# Altium footprint library DipComponent.PcbLib: 303 footprints (part 9 of 19)
Each footprint in its own frame and in the unit in brackets; x right, y up, seen from the top. Pads: shape width x height; smd on the part's side, far side on the other; paste and mask are expansions set on the pad; w line width, h text height; cw(c..) or ccw(c..) is an arc to the next point about the centre after c.
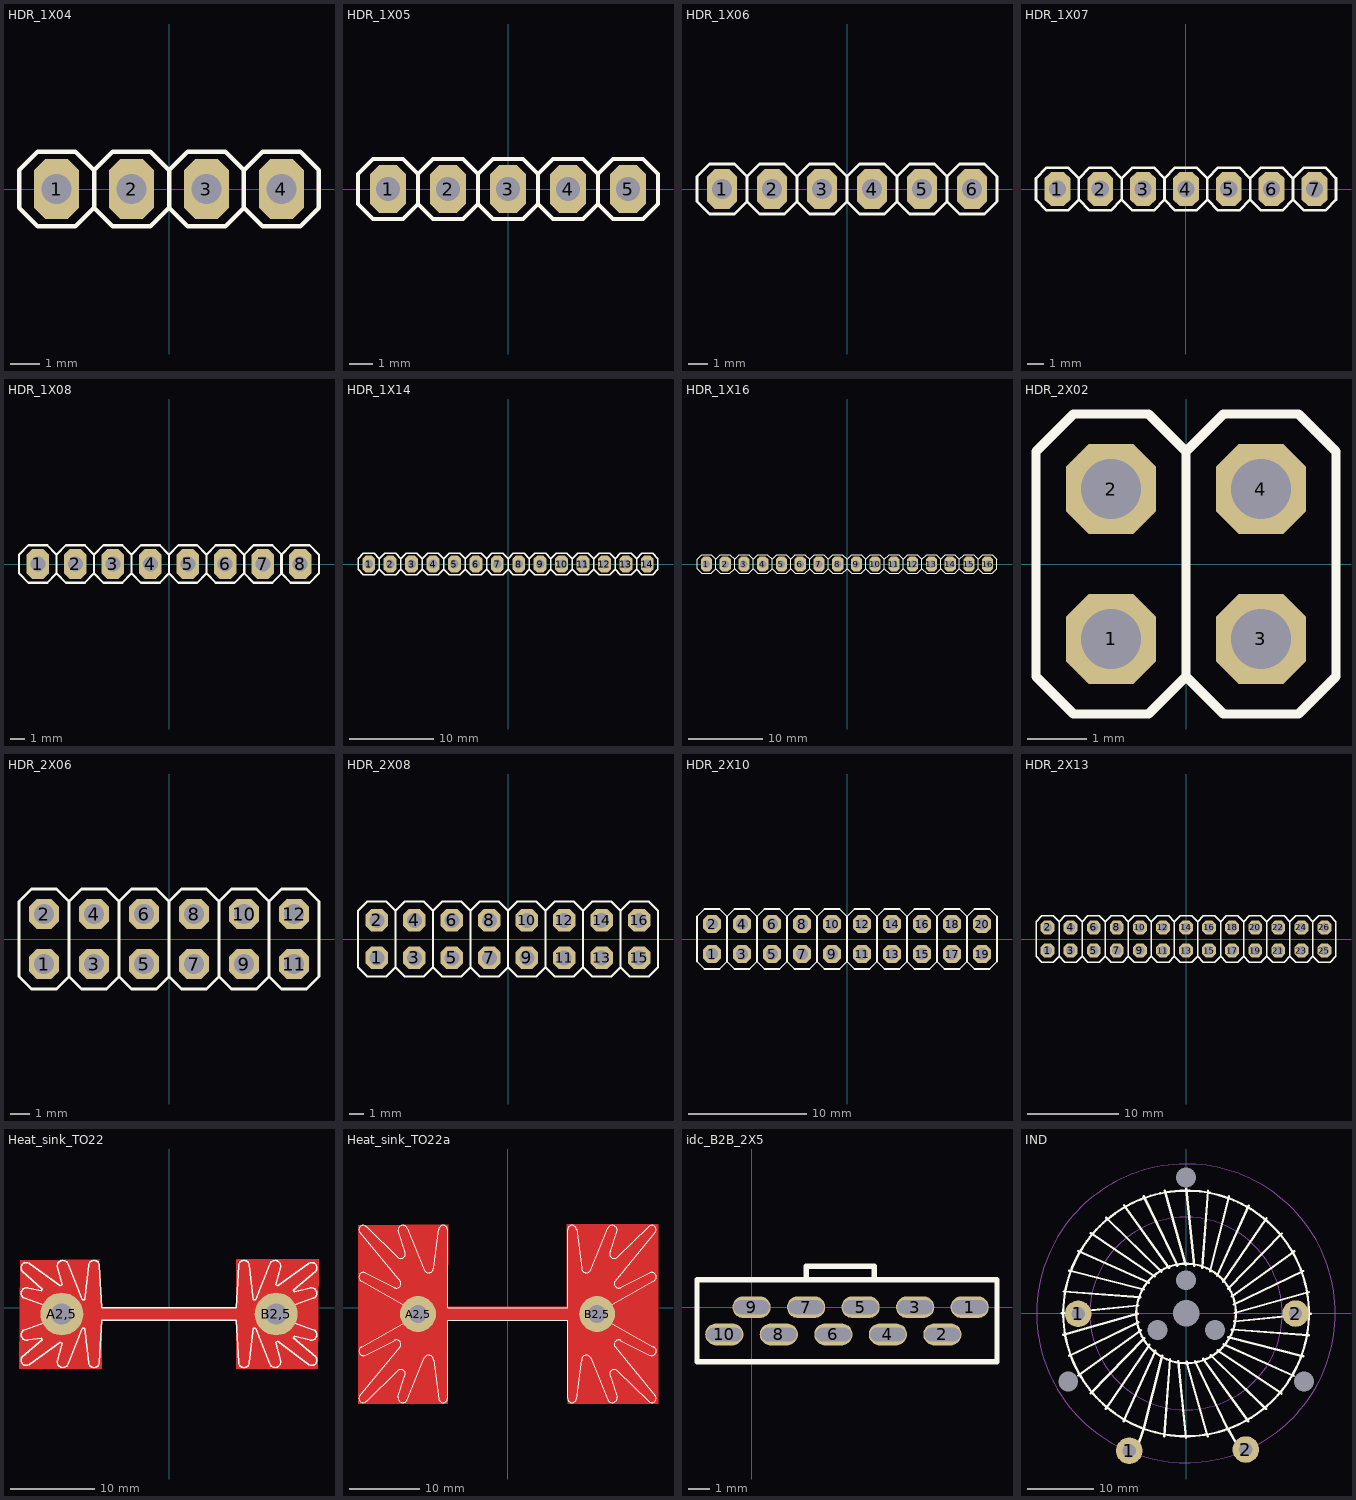
[diagram p8: the footprints below, top view; thin cyan lines are the x and y axes]

## HDR_1X04 [mil]
pads (4):
  oct 60x80 hole 40: 1(-150,0) 2(-50,0) 3(50,0) 4(150,0)
Top Overlay:
  rectangle: 40,-10 60,10
  rectangle: -60,-10 -40,10
  rectangle: -160,-10 -140,10
  rectangle: 140,-10 160,10
  lines w6: -100,-25 -100,25 ; -100,-25 -125,-50 -175,-50 -200,-25 -200,25 -175,50 -125,50 -100,25 ; -100,-25 -75,-50 -25,-50 0,-25 ; -100,25 -75,50 -25,50 0,25 ; 0,-25 25,-50 75,-50 100,-25 ; 0,-25 0,25 ; 0,25 25,50 75,50 100,25 ; 100,-25 100,25 ; 100,-25 125,-50 175,-50 200,-25 200,25 175,50 125,50 100,25
3D body "User Library-Header Vertical 2_54mm Pitch2-14 Way.STEP": height 233.86, standoff -115.75, extent -198.03,-49.21 201.97,50.79

## HDR_1X05 [mil]
pads (5):
  oct 60x80 hole 40: 1(-200,0) 2(-100,0) 3(0,0) 4(100,0) 5(200,0)
Top Overlay:
  rectangle: 90,-10 110,10
  rectangle: -10,-10 10,10
  rectangle: -110,-10 -90,10
  rectangle: -210,-10 -190,10
  rectangle: 190,-10 210,10
  lines w6: -150,-25 -150,25 ; -150,-25 -175,-50 -225,-50 -250,-25 -250,25 -225,50 -175,50 -150,25 ; -150,-25 -125,-50 -75,-50 -50,-25 ; -150,25 -125,50 -75,50 -50,25 ; -50,-25 -25,-50 25,-50 50,-25 ; -50,-25 -50,25 ; -50,25 -25,50 25,50 50,25 ; 50,-25 50,25 ; 50,-25 75,-50 125,-50 150,-25 ; 50,25 75,50 125,50 150,25 ; 150,-25 150,25 ; 150,-25 175,-50 225,-50 250,-25 250,25 225,50 175,50 150,25
3D body "PinHeader 1X5.step": height 335.04, standoff -144.88, extent -250,-59.06 250,55.91

## HDR_1X06 [mil]
pads (6):
  oct 60x80 hole 40: 1(-250,0) 2(-150,0) 3(-50,0) 4(50,0) 5(150,0) 6(250,0)
Top Overlay:
  rectangle: 240,-10 260,10
  rectangle: -260,-10 -240,10
  rectangle: -160,-10 -140,10
  rectangle: -60,-10 -40,10
  rectangle: 40,-10 60,10
  rectangle: 140,-10 160,10
  lines w6: -200,-25 -175,-50 -125,-50 -100,-25 ; -200,-25 -225,-50 -275,-50 -300,-25 -300,25 -275,50 -225,50 -200,25 ; -200,-25 -200,25 ; -200,25 -175,50 -125,50 -100,25 ; -100,-25 -100,25 ; -100,-25 -75,-50 -25,-50 0,-25 ; -100,25 -75,50 -25,50 0,25 ; 0,-25 25,-50 75,-50 100,-25 ; 0,-25 0,25 ; 0,25 25,50 75,50 100,25 ; 100,-25 125,-50 175,-50 200,-25 ; 100,-25 100,25 ; 100,25 125,50 175,50 200,25 ; 200,-25 225,-50 275,-50 300,-25 300,25 275,50 225,50 200,25 ; 200,-25 200,25
3D body "User Library-Header Vertical 2_54mm Pitch2-16 Way.STEP": height 233.86, standoff -115.75, extent -300,-51.18 300,48.82

## HDR_1X07 [mil]
pads (7):
  oct 60x80 hole 40: 1(-300.2,0) 2(-200.2,0) 3(-100.2,0) 4(-0.2,0) 5(99.8,0) 6(199.8,0) 7(300.2,0)
Top Overlay:
  rectangle: 189.8,-10 209.8,10
  rectangle: -310.2,-10 -290.2,10
  rectangle: -210.2,-10 -190.2,10
  rectangle: -110.2,-10 -90.2,10
  rectangle: -10.2,-10 9.8,10
  rectangle: 89.8,-10 109.8,10
  rectangle: 290.2,-10 310.2,10
  lines w6: -250.2,-25 -225.2,-50 -175.2,-50 -150.2,-25 ; -250.2,-25 -275.2,-50 -325.2,-50 -350.2,-25 -350.2,25 -325.2,50 -275.2,50 -250.2,25 ; -250.2,-25 -250.2,25 ; -250.2,25 -225.2,50 -175.2,50 -150.2,25 ; -150.2,-25 -150.2,25 ; -150.2,-25 -125.2,-50 -75.2,-50 -50.2,-25 ; -150.2,25 -125.2,50 -75.2,50 -50.2,25 ; -50.2,-25 -25.2,-50 24.8,-50 49.8,-25 ; -50.2,-25 -50.2,25 ; -50.2,25 -25.2,50 24.8,50 49.8,25 ; 49.8,-25 74.8,-50 124.8,-50 149.8,-25 ; 49.8,-25 49.8,25 ; 49.8,25 74.8,50 124.8,50 149.8,25 ; 149.8,-25 174.8,-50 224.8,-50 249.8,-25 249.8,25 224.8,50 174.8,50 149.8,25 ; 149.8,-25 149.8,25 ; 250.2,-25 250.2,25 275.2,50 325.2,50 350.2,25 350.2,-25 325.2,-50 275.2,-50 250.2,-25
3D body "User Library-Header_Male_7Pin.STEP": height 336.22, standoff -118.11, extent -348.03,-48.82 351.97,49.21

## HDR_1X08 [mil]
pads (8):
  oct 60x80 hole 40: 1(-350,0) 2(-250,0) 3(-150,0) 4(-50,0) 5(50,0) 6(150,0) 7(250.39,0) 8(350,0)
Top Overlay:
  rectangle: 240.39,-10 260.39,10
  rectangle: 40,-10 60,10
  rectangle: -60,-10 -40,10
  rectangle: -160,-10 -140,10
  rectangle: -260,-10 -240,10
  rectangle: -360,-10 -340,10
  rectangle: 140,-10 160,10
  rectangle: 340,-10 360,10
  lines w6: 299.61,-25 299.61,25 ; -300,-25 -300,25 ; -300,-25 -325,-50 -375,-50 -400,-25 -400,25 -375,50 -325,50 -300,25 ; -300,-25 -275,-50 -225,-50 -200,-25 ; -300,25 -275,50 -225,50 -200,25 ; -200,-25 -175,-50 -125,-50 -100,-25 ; -200,-25 -200,25 ; -200,25 -175,50 -125,50 -100,25 ; -100,-25 -100,25 ; -100,-25 -75,-50 -25,-50 0,-25 ; -100,25 -75,50 -25,50 0,25 ; 0,-25 0,25 ; 0,-25 25,-50 75,-50 100,-25 ; 0,25 25,50 75,50 100,25 ; 100,-25 100,25 ; 100,-25 125,-50 175,-50 200,-25 200,25 175,50 125,50 100,25 ; 200.39,-25 225.39,-50 275.39,-50 300.39,-25 300.39,25 275.39,50 225.39,50 200.39,25 200.39,-25 ; 300,-25 300,25 325,50 375,50 400,25 400,-25 375,-50 325,-50 300,-25
3D body "User Library-Header_Male_8Pin.STEP": height 336.22, standoff -118.11, extent -400,-49.01 400,49.02

## HDR_1X14 [mil]
pads (14):
  oct 60x80 hole 40: 1(-650,0) 2(-550,0) 3(-450,0) 4(-350,0) 5(-250,0) 6(-150,0) 7(-50,0) 8(50,0) 9(150,0) 10(250,0) 11(350,0) 12(450,0) 13(550,0) 14(650,0)
Top Overlay:
  rectangle: 540,-10 560,10
  rectangle: 440,-10 460,10
  rectangle: 340,-10 360,10
  rectangle: 240,-10 260,10
  rectangle: 140,-10 160,10
  rectangle: 40,-10 60,10
  rectangle: -60,-10 -40,10
  rectangle: -160,-10 -140,10
  rectangle: -260,-10 -240,10
  rectangle: -360,-10 -340,10
  rectangle: -460,-10 -440,10
  rectangle: -560,-10 -540,10
  rectangle: -660,-10 -640,10
  rectangle: 640,-10 660,10
  lines w6: -600,-25 -600,25 ; -600,-25 -625,-50 -675,-50 -700,-25 -700,25 -675,50 -625,50 -600,25 ; -600,-25 -575,-50 -525,-50 -500,-25 ; -600,25 -575,50 -525,50 -500,25 ; -500,-25 -475,-50 -425,-50 -400,-25 ; -500,-25 -500,25 ; -500,25 -475,50 -425,50 -400,25 ; -400,-25 -400,25 ; -400,-25 -375,-50 -325,-50 -300,-25 ; -400,25 -375,50 -325,50 -300,25 ; -300,-25 -300,25 ; -300,-25 -275,-50 -225,-50 -200,-25 ; -300,25 -275,50 -225,50 -200,25 ; -200,-25 -175,-50 -125,-50 -100,-25 ; -200,-25 -200,25 ; -200,25 -175,50 -125,50 -100,25 ; -100,-25 -100,25 ; -100,-25 -75,-50 -25,-50 0,-25 ; -100,25 -75,50 -25,50 0,25 ; 0,-25 0,25 ; 0,-25 25,-50 75,-50 100,-25 ; 0,25 25,50 75,50 100,25 ; 100,-25 125,-50 175,-50 200,-25 ; 100,-25 100,25 ; 100,25 125,50 175,50 200,25 ; 200,-25 200,25 ; 200,-25 225,-50 275,-50 300,-25 ; 200,25 225,50 275,50 300,25 ; 300,-25 300,25 ; 300,-25 325,-50 375,-50 400,-25 ; 300,25 325,50 375,50 400,25 ; 400,-25 425,-50 475,-50 500,-25 ; 400,-25 400,25 ; 400,25 425,50 475,50 500,25 ; 500,-25 500,25 ; 500,-25 525,-50 575,-50 600,-25 ; 500,25 525,50 575,50 600,25 ; 600,-25 600,25 ; 600,-25 625,-50 675,-50 700,-25 700,25 675,50 625,50 600,25
3D body "User Library-Header Vertical 2_54mm Pitch2-12 Way.STEP": height 233.86, standoff -115.75, extent 502.76,-51.97 702.76,48.03
3D body "User Library-Header Vertical 2_54mm Pitch2-16 Way.STEP": height 233.86, standoff -115.75, extent -698.81,-50.79 -98.81,49.21
3D body "User Library-Header Vertical 2_54mm Pitch2-16 Way.STEP": height 233.86, standoff -115.75, extent -97.24,-51.18 502.76,48.82

## HDR_1X16 [mil]
pads (16):
  oct 60x80 hole 40: 1(-750,0) 2(-650,0) 3(-550,0) 4(-450,0) 5(-350,0) 6(-250,0) 7(-150,0) 8(-50,0) 9(50,0) 10(150,0) 11(250,0) 12(350,0) 13(450,0) 14(550,0) 15(650,0) 16(750,0)
Top Overlay:
  rectangle: 640,-10 660,10
  rectangle: 540,-10 560,10
  rectangle: 440,-10 460,10
  rectangle: 340,-10 360,10
  rectangle: 240,-10 260,10
  rectangle: 140,-10 160,10
  rectangle: 40,-10 60,10
  rectangle: -60,-10 -40,10
  rectangle: -160,-10 -140,10
  rectangle: -260,-10 -240,10
  rectangle: -360,-10 -340,10
  rectangle: -460,-10 -440,10
  rectangle: -560,-10 -540,10
  rectangle: -660,-10 -640,10
  rectangle: -760,-10 -740,10
  rectangle: 740,-10 760,10
  lines w6: -700,-25 -700,25 ; -700,-25 -725,-50 -775,-50 -800,-25 -800,25 -775,50 -725,50 -700,25 ; -700,-25 -675,-50 -625,-50 -600,-25 ; -700,25 -675,50 -625,50 -600,25 ; -600,-25 -575,-50 -525,-50 -500,-25 ; -600,-25 -600,25 ; -600,25 -575,50 -525,50 -500,25 ; -500,-25 -500,25 ; -500,-25 -475,-50 -425,-50 -400,-25 ; -500,25 -475,50 -425,50 -400,25 ; -400,-25 -400,25 ; -400,-25 -375,-50 -325,-50 -300,-25 ; -400,25 -375,50 -325,50 -300,25 ; -300,-25 -275,-50 -225,-50 -200,-25 ; -300,-25 -300,25 ; -300,25 -275,50 -225,50 -200,25 ; -200,-25 -200,25 ; -200,-25 -175,-50 -125,-50 -100,-25 ; -200,25 -175,50 -125,50 -100,25 ; -100,-25 -100,25 ; -100,-25 -75,-50 -25,-50 0,-25 ; -100,25 -75,50 -25,50 0,25 ; 0,-25 25,-50 75,-50 100,-25 ; 0,-25 0,25 ; 0,25 25,50 75,50 100,25 ; 100,-25 100,25 ; 100,-25 125,-50 175,-50 200,-25 ; 100,25 125,50 175,50 200,25 ; 200,-25 200,25 ; 200,-25 225,-50 275,-50 300,-25 ; 200,25 225,50 275,50 300,25 ; 300,-25 325,-50 375,-50 400,-25 ; 300,-25 300,25 ; 300,25 325,50 375,50 400,25 ; 400,-25 400,25 ; 400,-25 425,-50 475,-50 500,-25 ; 400,25 425,50 475,50 500,25 ; 500,-25 500,25 ; 500,-25 525,-50 575,-50 600,-25 ; 500,25 525,50 575,50 600,25 ; 600,-25 625,-50 675,-50 700,-25 ; 600,-25 600,25 ; 600,25 625,50 675,50 700,25 ; 700,-25 700,25 ; 700,-25 725,-50 775,-50 800,-25 800,25 775,50 725,50 700,25
3D body "User Library-Header Vertical 2_54mm Pitch2-16 Way.STEP": height 233.86, standoff -115.75, extent -200.79,-50.79 399.21,49.21
3D body "User Library-Header Vertical 2_54mm Pitch2-16 Way.STEP": height 233.86, standoff -115.75, extent -800.79,-50.79 -200.79,49.21
3D body "User Library-Header Vertical 2_54mm Pitch2-14 Way.STEP": height 233.86, standoff -115.75, extent 399.61,-50.79 799.61,49.21

## HDR_2X02 [mil]
pads (4):
  oct 60x60 hole 40: 1(-50,-50) 2(-50,50) 3(50,-50) 4(50,50)
Top Overlay:
  rectangle: -60,-60 -40,-40
  rectangle: -60,40 -40,60
  rectangle: 40,40 60,60
  rectangle: 40,-60 60,-40
  lines w6: 0,-75 -25,-100 -75,-100 -100,-75 -100,75 -75,100 -25,100 0,75 ; 0,-75 25,-100 75,-100 100,-75 100,75 75,100 25,100 0,75 ; 0,-75 0,75
3D body "User Library-Header Vertical 2_54mm Pitch2-1Header 4 Way.STEP": height 233.86, standoff -115.75, extent -98.03,-99.6 101.97,100.4

## HDR_2X06 [mil]
pads (12):
  oct 60x60 hole 40: 1(-250,-50) 2(-250,50) 3(-150,-50) 4(-150,50) 5(-50,-50) 6(-50,50) 7(50,-50) 8(50,50) 9(150,-50) 10(150,50) 11(250,-50) 12(250,50)
Top Overlay:
  rectangle: -260,-60 -240,-40
  rectangle: -260,40 -240,60
  rectangle: -160,40 -140,60
  rectangle: -160,-60 -140,-40
  rectangle: -60,40 -40,60
  rectangle: -60,-60 -40,-40
  rectangle: 40,40 60,60
  rectangle: 140,40 160,60
  rectangle: 40,-60 60,-40
  rectangle: 140,-60 160,-40
  rectangle: 240,40 260,60
  rectangle: 240,-60 260,-40
  lines w6: -200,-75 -225,-100 -275,-100 -300,-75 -300,75 -275,100 -225,100 -200,75 ; -200,-75 -175,-100 -125,-100 -100,-75 ; -200,-75 -200,75 ; -200,75 -175,100 -125,100 -100,75 ; -100,-75 -75,-100 -25,-100 0,-75 ; -100,-75 -100,75 ; -100,75 -75,100 -25,100 0,75 ; 0,-75 25,-100 75,-100 100,-75 ; 0,-75 0,75 ; 0,75 25,100 75,100 100,75 ; 100,-75 125,-100 175,-100 200,-75 ; 100,-75 100,75 ; 100,75 125,100 175,100 200,75 ; 200,-75 200,75 ; 200,-75 225,-100 275,-100 300,-75 300,75 275,100 225,100 200,75
3D body "User Library-Header Vertical 2_54mm Pitch2-1Header 6 Way.STEP": height 233.86, standoff -115.75, extent 0,-101.97 300,98.03
3D body "User Library-Header Vertical 2_54mm Pitch2-1Header 6 Way.STEP": height 233.86, standoff -115.75, extent -300,-101.97 0,98.03

## HDR_2X08 [mil]
pads (16):
  oct 60x60 hole 40: 1(-350,-50) 2(-350,50) 3(-250,-50) 4(-250,50) 5(-150,-50) 6(-150,50) 7(-50,-50) 8(-50,50) 9(50,-50) 10(50,50) 11(150,-50) 12(150,50) 13(250,-50) 14(250,50) 15(350,-50) 16(350,50)
Top Overlay:
  rectangle: -360,-60 -340,-40
  rectangle: -360,40 -340,60
  rectangle: -260,40 -240,60
  rectangle: -260,-60 -240,-40
  rectangle: -160,40 -140,60
  rectangle: -160,-60 -140,-40
  rectangle: -60,40 -40,60
  rectangle: 40,40 60,60
  rectangle: 140,40 160,60
  rectangle: -60,-60 -40,-40
  rectangle: 40,-60 60,-40
  rectangle: 140,-60 160,-40
  rectangle: 240,40 260,60
  rectangle: 240,-60 260,-40
  rectangle: 340,40 360,60
  rectangle: 340,-60 360,-40
  lines w6: -300,-75 -325,-100 -375,-100 -400,-75 -400,75 -375,100 -325,100 -300,75 ; -300,-75 -275,-100 -225,-100 -200,-75 ; -300,-75 -300,75 ; -300,75 -275,100 -225,100 -200,75 ; -200,-75 -175,-100 -125,-100 -100,-75 ; -200,-75 -200,75 ; -200,75 -175,100 -125,100 -100,75 ; -100,-75 -75,-100 -25,-100 0,-75 ; -100,-75 -100,75 ; -100,75 -75,100 -25,100 0,75 ; 0,-75 25,-100 75,-100 100,-75 ; 0,-75 0,75 ; 0,75 25,100 75,100 100,75 ; 100,-75 125,-100 175,-100 200,-75 ; 100,-75 100,75 ; 100,75 125,100 175,100 200,75 ; 200,-75 225,-100 275,-100 300,-75 ; 200,-75 200,75 ; 200,75 225,100 275,100 300,75 ; 300,-75 300,75 ; 300,-75 325,-100 375,-100 400,-75 400,75 375,100 325,100 300,75
3D body "User Library-Header Vertical 2_54mm Pitch2-1Header 16 Way.STEP": height 233.86, standoff -115.75, extent -401.97,-102.36 398.03,97.64

## HDR_2X10 [mil]
pads (20):
  oct 60x60 hole 40: 1(-450,-50) 2(-450,50) 3(-350,-50) 4(-350,50) 5(-250,-50) 6(-250,50) 7(-150,-50) 8(-150,50) 9(-50,-50) 10(-50,50) 11(50,-50) 12(50,50) 13(150,-50) 14(150,50) 15(250,-50) 16(250,50) 17(350,-50) 18(350,50) 19(450,-50) 20(450,50)
Top Overlay:
  rectangle: 440,-60 460,-40
  rectangle: 440,40 460,60
  rectangle: 340,-60 360,-40
  rectangle: 340,40 360,60
  rectangle: 240,-60 260,-40
  rectangle: 240,40 260,60
  rectangle: 140,-60 160,-40
  rectangle: 140,40 160,60
  rectangle: 40,-60 60,-40
  rectangle: -60,-60 -40,-40
  rectangle: -160,-60 -140,-40
  rectangle: 40,40 60,60
  rectangle: -60,40 -40,60
  rectangle: -160,40 -140,60
  rectangle: -260,-60 -240,-40
  rectangle: -260,40 -240,60
  rectangle: -360,-60 -340,-40
  rectangle: -360,40 -340,60
  rectangle: -460,40 -440,60
  rectangle: -460,-60 -440,-40
  lines w6: -400,-75 -400,75 ; -400,-75 -375,-100 -325,-100 -300,-75 ; -400,-75 -425,-100 -475,-100 -500,-75 -500,75 -475,100 -425,100 -400,75 ; -400,75 -375,100 -325,100 -300,75 ; -300,-75 -300,75 ; -300,-75 -275,-100 -225,-100 -200,-75 ; -300,75 -275,100 -225,100 -200,75 ; -200,-75 -200,75 ; -200,-75 -175,-100 -125,-100 -100,-75 ; -200,75 -175,100 -125,100 -100,75 ; -100,-75 -100,75 ; -100,-75 -75,-100 -25,-100 0,-75 ; -100,75 -75,100 -25,100 0,75 ; 0,-75 0,75 ; 0,-75 25,-100 75,-100 100,-75 ; 0,75 25,100 75,100 100,75 ; 100,-75 100,75 ; 100,-75 125,-100 175,-100 200,-75 ; 100,75 125,100 175,100 200,75 ; 200,-75 200,75 ; 200,-75 225,-100 275,-100 300,-75 ; 200,75 225,100 275,100 300,75 ; 300,-75 300,75 ; 300,-75 325,-100 375,-100 400,-75 ; 300,75 325,100 375,100 400,75 ; 400,-75 425,-100 475,-100 500,-75 500,75 475,100 425,100 400,75 ; 400,-75 400,75
3D body "User Library-Header Vertical 2_54mm Pitch2-12 Way.STEP": height 233.86, standoff -115.75, extent 398.03,-98.03 498.03,101.97
3D body "User Library-Header Vertical 2_54mm Pitch2-1Header 6 Way.STEP": height 233.86, standoff -115.75, extent -500,-98.03 -200,101.97
3D body "User Library-Header Vertical 2_54mm Pitch2-1Header 6 Way.STEP": height 233.86, standoff -115.75, extent -200.79,-98.03 99.21,101.97
3D body "User Library-Header Vertical 2_54mm Pitch2-1Header 6 Way.STEP": height 233.86, standoff -115.75, extent 98.43,-98.03 398.43,101.97

## HDR_2X13 [mil]
pads (26):
  oct 60x60 hole 40: 1(-600,-50) 2(-600,50) 3(-500,-50) 4(-500,50) 5(-400,-50) 6(-400,50) 7(-300,-50) 8(-300,50) 9(-200,-50) 10(-200,50) 11(-100,-50) 12(-100,50) 13(0,-50) 14(0,50) 15(100,-50) 16(100,50) 17(200,-50) 18(200,50) 19(300,-50) 20(300,50) 21(400,-50) 22(400,50) 23(500,-50) 24(500,50) 25(600,-50) 26(600,50)
Top Overlay:
  rectangle: -610,-60 -590,-40
  rectangle: -610,40 -590,60
  rectangle: -510,40 -490,60
  rectangle: -510,-60 -490,-40
  rectangle: -410,40 -390,60
  rectangle: -410,-60 -390,-40
  rectangle: -310,40 -290,60
  rectangle: -210,40 -190,60
  rectangle: -110,40 -90,60
  rectangle: -310,-60 -290,-40
  rectangle: -210,-60 -190,-40
  rectangle: -110,-60 -90,-40
  rectangle: -10,40 10,60
  rectangle: -10,-60 10,-40
  rectangle: 90,40 110,60
  rectangle: 90,-60 110,-40
  rectangle: 190,40 210,60
  rectangle: 190,-60 210,-40
  rectangle: 290,40 310,60
  rectangle: 290,-60 310,-40
  rectangle: 390,-60 410,-40
  rectangle: 390,40 410,60
  rectangle: 490,40 510,60
  rectangle: 490,-60 510,-40
  rectangle: 590,40 610,60
  rectangle: 590,-60 610,-40
  lines w6: -550,-75 -575,-100 -625,-100 -650,-75 -650,75 -625,100 -575,100 -550,75 ; -550,-75 -525,-100 -475,-100 -450,-75 ; -550,-75 -550,75 ; -550,75 -525,100 -475,100 -450,75 ; -450,-75 -425,-100 -375,-100 -350,-75 ; -450,-75 -450,75 ; -450,75 -425,100 -375,100 -350,75 ; -350,-75 -325,-100 -275,-100 -250,-75 ; -350,-75 -350,75 ; -350,75 -325,100 -275,100 -250,75 ; -250,-75 -225,-100 -175,-100 -150,-75 ; -250,-75 -250,75 ; -250,75 -225,100 -175,100 -150,75 ; -150,-75 -125,-100 -75,-100 -50,-75 ; -150,-75 -150,75 ; -150,75 -125,100 -75,100 -50,75 ; -50,-75 -25,-100 25,-100 50,-75 ; -50,-75 -50,75 ; -50,75 -25,100 25,100 50,75 ; 50,-75 75,-100 125,-100 150,-75 ; 50,-75 50,75 ; 50,75 75,100 125,100 150,75 ; 150,-75 175,-100 225,-100 250,-75 ; 150,-75 150,75 ; 150,75 175,100 225,100 250,75 ; 250,-75 250,75 ; 250,-75 275,-100 325,-100 350,-75 ; 250,75 275,100 325,100 350,75 ; 350,-75 350,75 ; 350,-75 375,-100 425,-100 450,-75 ; 350,-75 350,75 ; 350,75 375,100 425,100 450,75 ; 450,-75 450,75 ; 450,-75 450,75 ; 450,-75 475,-100 525,-100 550,-75 ; 450,-75 450,75 ; 450,75 475,100 525,100 550,75 ; 550,-75 550,75 ; 550,-75 550,75 ; 550,-75 575,-100 625,-100 650,-75 650,75 625,100 575,100 550,75 ; 550,-75 550,75
3D body "User Library-LP26V.STEP": height 372.44, standoff -125.98, extent -800,-173.23 800,188.98

## Heat_sink_TO22 [mil]
pads (2):
  round 200 hole 100: A2,5(-500,-30) B2,5(500,-30)
Top Layer:
  region: 700,225 315,225 315,0 -315,0 -325,225 -695,220 -700,-285 -315,-285 -315,-60 315,-60 315,-285 695,-285
Top Overlay:
  lines w6: -677,-105 -595,-75 -535,-55 ccw(c-500,-30) -535,-5 -595,15 -677,45 ; -675.38,-104.16 ccw(c-665,-126.99) -655,-149.99 -596,-143 -591,-150 -685,-230 ccw(c-665,-245) -645,-260 ; -675.38,44.17 cw(c-665,67) -655,90 -596,78 -591,85 -685,170 cw(c-665,185) -645,200 ; -649,-264 -507,-162 -499,-166 -522,-250 ; -649,204 -507,102 -499,106 -522,190 ; -521.56,-248.57 ccw(c-495,-253) -470,-263 -404,-97 -393,-97 -375,-257 ; -521.56,188.57 cw(c-495,193) -470,203 -404,37 -393,37 -375,197 ; -375,-255 ccw(c-350,-255) -325,-255 -315,-60 315,-60 325,-255 ccw(c350,-255) 375,-255 ; -375,195 cw(c-350,195) -325,195 -315,0 315,0 325,195 cw(c350,195) 375,195 ; 375,-256 393,-97 404,-97 470,-263 ccw(c494.99,-253) 521.55,-248.57 ; 375,198 393,37 404,37 470,203 cw(c494.99,193) 521.55,188.57 ; 522,-250 499,-161 507,-157 649,-264 ; 522,190 499,106 507,102 649,204 ; 535,-55 595,-75 677,-105 ; 535.78,-53.85 cw(c500,-29.99) 535,-4.99 595,15 676,45 ; 645,-260 ccw(c665,-245) 685,-230 581,-140 586,-133 655,-150 ccw(c665,-126.99) 675.38,-104.16 ; 645,200 cw(c665,185) 685,170 581,80 586,73 655,90 cw(c665,67) 675.38,44.17
Mechanical 2:
  text "2,5" at 450,-150 h50
  text "2,5" at -575,-150 h50
3D body "SW3dPS-HeatSink TO220.STEP": height 984.25, standoff -133.86, extent -649.61,-253.94 681.1,202.76

## Heat_sink_TO22a [mil]
pads (2):
  round 200 hole 100: A2,5(-500,-35) B2,5(500,-35)
Top Layer:
  region: 840,465 330,465 330,5 -335,5 -330,465 -835,460 -835,-535 -335,-535 -335,-75 335,-70 335,-535 840,-535
Top Overlay:
  lines w6: -825,-491 -600,-218 ; -825,-490 ccw(c-805,-505) -785,-520 ; -825,420 cw(c-805,435) -785,450 ; -825,421 -600,148 ; -816,-220 -585,-90 -540,-65 ccw(c-500,-35) -540,-5 -585,20 -816,150 ; -815.38,-219.16 ccw(c-805,-241.99) -795,-264.99 -633,-183 ; -815.38,149.17 cw(c-805,172) -795,195 -633,113 ; -787,-522 -612,-352 ; -787,452 -612,282 ; -635.22,-184.15 cw(c-621.01,-205) -600.01,-219 ; -635.22,114.15 ccw(c-621,135) -600,149 ; -615,-355 cw(c-595,-370) -575,-385 ; -615,285 ccw(c-595,300) -575,315 ; -612,-500 -573,-381 ; -612,430 -573,311 ; -611.56,-498.57 ccw(c-585,-503) -560,-513 -464,-280 ; -611.56,428.57 cw(c-585,433) -560,443 -464,210 ; -465,-282 cw(c-440,-292) -413.44,-296.43 ; -465,212 ccw(c-440,222) -413.44,226.43 ; -413,-294 -385,-507 ; -413,224 -385,437 ; -385,-505 ccw(c-360,-505) -335,-505 -335,-70 335,-70 335,-505 ccw(c360,-505) 385,-505 ; -385,435 cw(c-360,435) -335,435 -335,0 -300,0 335,0 335,435 cw(c360,435) 385,435 ; 385,-507 413,-294 ; 385,437 413,224 ; 413.44,-296.43 cw(c440,-292) 465,-282 ; 413.44,226.43 ccw(c440,222) 465,212 ; 464,-280 560,-513 ccw(c584.99,-503) 611.55,-498.57 ; 464,210 560,443 cw(c584.99,433) 611.55,428.57 ; 573,-381 612,-500 ; 573,311 612,430 ; 575,-385 cw(c595,-370) 615,-355 ; 575,315 ccw(c595,300) 615,285 ; 599.99,-219 cw(c620.99,-205) 635.21,-184.15 ; 600,-218 825,-491 ; 600,148 825,421 ; 599.99,149 ccw(c621,135) 635.22,114.14 ; 612,-352 787,-522 ; 612,282 787,452 ; 633,-183 795,-265 ccw(c805,-241.99) 815.38,-219.16 ; 633,113 795,195 cw(c805,172) 815.38,149.17 ; 785,-520 ccw(c805,-505) 825,-490 ; 785,450 cw(c805,435) 825,420 ; 816,-220 585,-90 540,-65 cw(c500,-35) 540,-5 585,20 816,150
Mechanical 2:
  text "2,5" at 450,-150 h50
  text "2,5" at -550,-150 h50

## idc_B2B_2X5 [mil]
pads (10):
  oval 70x40 hole 25 slot 65 at 0 deg: 1(400,0) 2(350,-50) 3(300,0) 4(250,-50) 5(200,0) 6(150,-50) 7(100,0) 8(50,-50) 9(0,0) 10(-50,-50)
Top Overlay:
  lines w10: 100,50 100,75 225,75 225,55 ; -100,-100 -100,50 450,50 450,-100 -100,-100

## IND [mm]
height 16.5
pads (11):
  round 4 hole 2: 1(-16.259,-0.058) 1(-8.574,-20.68) 2(9,-20.5) 2(16.486,-0.013)
  round 0 hole 3: ""(-17.755,-10.25) ""(-4.33,-2.5) ""(0,5) ""(0,20.5) ""(4.33,-2.5) ""(17.753,-10.251)
  round 0 hole 4: ""(0,0)
Top Overlay:
  circle w0.35: c0,0 r18.5
  circle w0.35: c0,0 r7.5
  lines w0.35: -18.774,0.035 -7.198,1.207 ; -18.494,-3.226 -7.297,-0.062 ; -18.483,3.295 -6.879,2.439 ; -17.652,-6.389 -7.175,-1.329 ; -17.63,6.455 -6.352,3.597 ; -16.274,-9.358 -6.835,-2.555 ; -16.242,9.419 -5.631,4.646 ; -14.401,-12.042 -6.286,-3.704 ; -14.36,12.097 -4.74,5.554 ; -12.09,-14.36 -5.547,-4.74 ; -12.042,14.407 -3.704,6.293 ; -9.412,-16.242 -4.639,-5.631 ; -9.358,16.28 -2.555,6.841 ; -7.435,-20.417 -6.392,-17.331 ; -6.448,-17.63 -3.59,-6.352 ; -6.389,17.658 -1.329,7.181 ; -3.288,-18.483 -2.432,-6.879 ; -3.226,18.5 -0.062,7.304 ; -1.2,-7.198 -0.028,-18.774 ; 0.035,18.78 1.207,7.204 ; 0.069,-7.297 3.233,-18.494 ; 1.335,-7.175 6.396,-17.652 ; 2.439,6.886 3.295,18.489 ; 2.562,-6.835 9.364,-16.274 ; 3.597,6.358 6.455,17.637 ; 3.71,-6.286 12.049,-14.401 ; 4.646,5.638 9.419,16.249 ; 4.746,-5.547 14.367,-12.09 ; 5.554,4.746 12.097,14.367 ; 5.638,-4.639 16.249,-9.413 ; 6.293,3.71 14.407,12.049 ; 6.337,-17.463 7.669,-19.772 ; 6.841,2.562 16.28,9.364 ; 6.886,-2.432 18.489,-3.288 ; 7.182,1.335 17.658,6.396 ; 7.204,-1.2 18.78,-0.028 ; 7.304,0.069 18.5,3.233 ; 6.358,-3.59 17.637,-6.448 6.358,-3.59
Mechanical 3:
  circle w0.025: c-0.021,0.013 r22.5
Mechanical 15:
  circle w0.025: c-0.002,-0.006 r14.5
3D body "Inductor.STEP": height 21.37, standoff 0.63, extent -20.804,-20.562 20.726,20.967